# Altium footprint library 20210518.PcbLib: 414 footprints (part 10 of 26)
Each footprint in its own frame and in the unit in brackets; x right, y up, seen from the top. Pads: shape width x height; smd on the part's side, far side on the other; paste and mask are expansions set on the pad; w line width, h text height; cw(c..) or ccw(c..) is an arc to the next point about the centre after c.
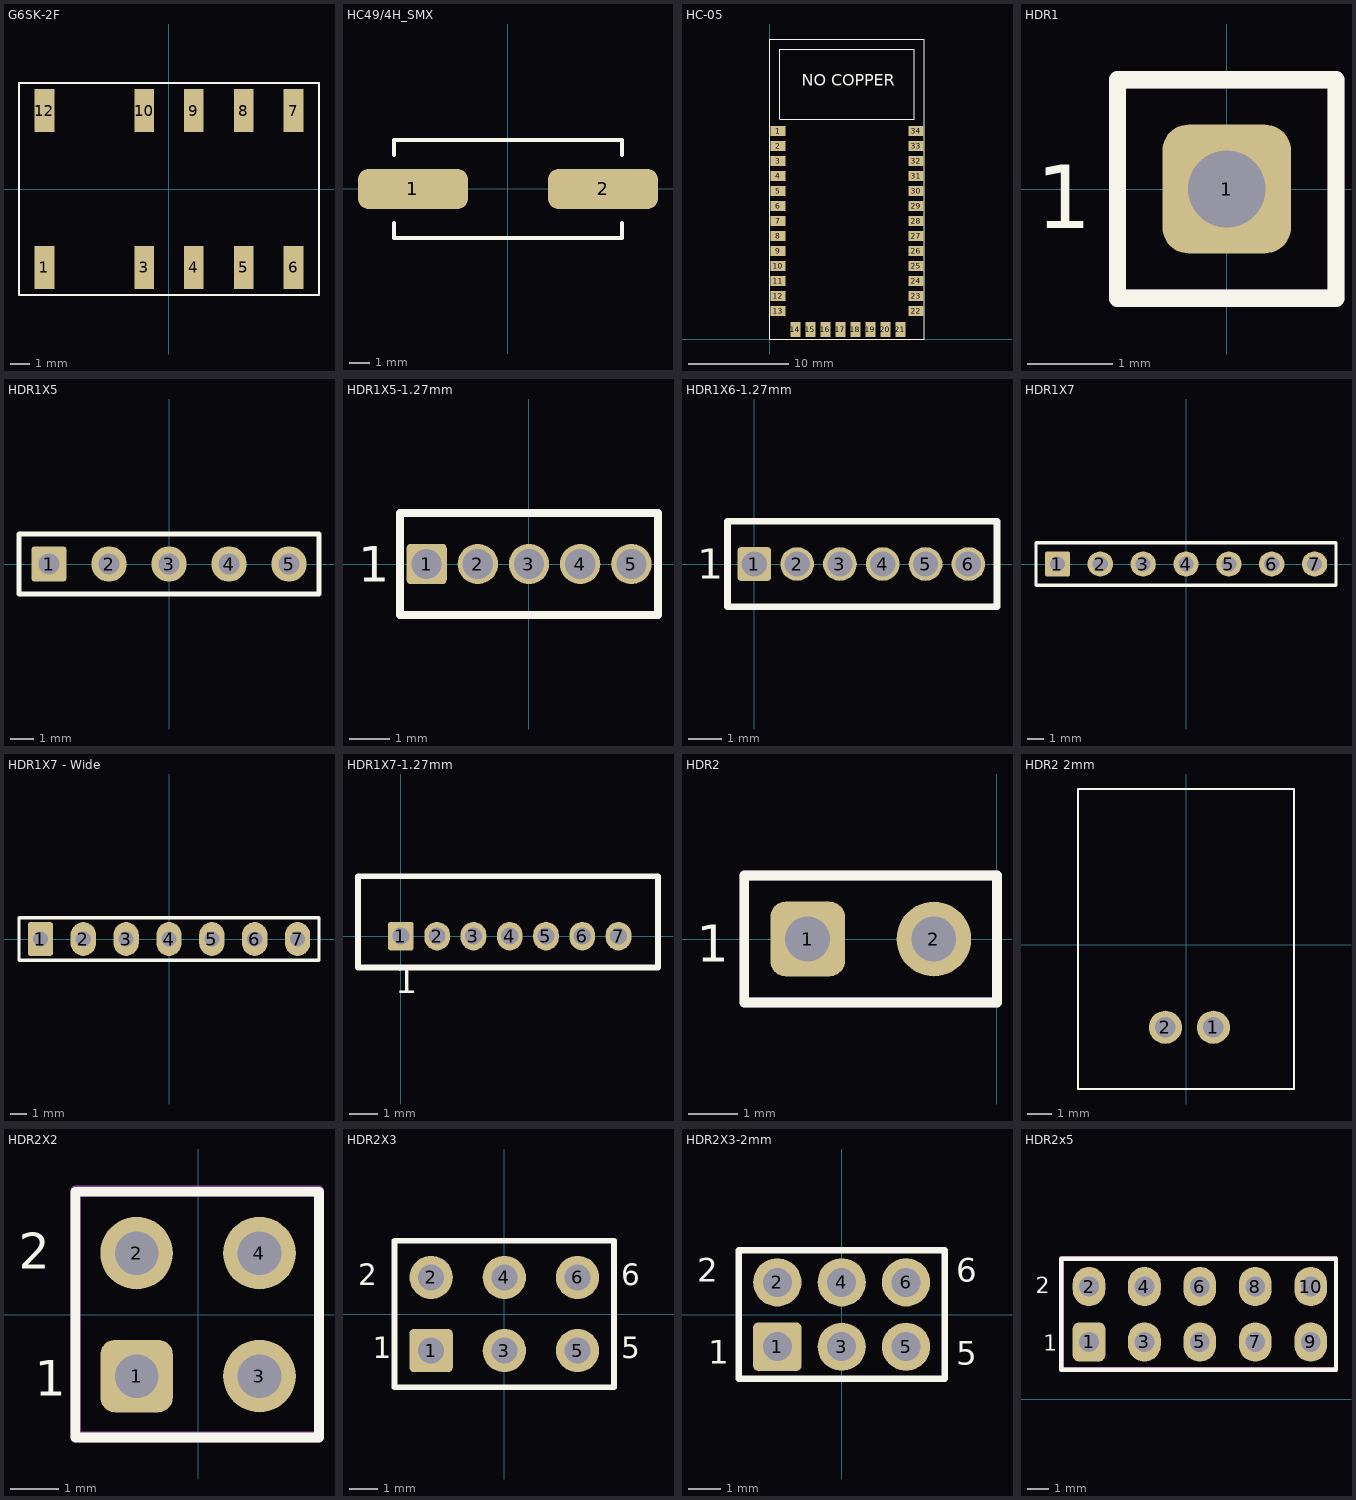
[diagram p9: the footprints below, top view; thin cyan lines are the x and y axes]

## G6SK-2F [mm]
pads (10):
  rect 1x2.2 smd: 1(-6.35,-4) 3(-1.27,-4) 4(1.27,-4) 5(3.81,-4) 6(6.35,-4) 7(6.35,4) 8(3.81,4) 9(1.27,4) 10(-1.27,4) 12(-6.35,4)
Top Overlay:
  lines w0.1: -7.65,-5.4 -7.65,5.4 7.65,5.4 7.65,-5.4 -7.65,-5.4
3D body: height 9.2, standoff 0, extent -7.42,-4.6 7.38,4.6

## HC49/4H_SMX [mm] "Quartz Crystal, SM; Body 13.4 (inc. leads) x 4.9 mm (LxW max)"
height 4.3
pads (2):
  rrect50% 5.5x2 smd: 1(-4.75,0) 2(4.75,0)
Top Overlay:
  lines w0.2: -5.7,-1.7 -5.7,-2.45 5.7,-2.45 5.7,-1.7 ; -5.7,1.7 -5.7,2.45 5.7,2.45 5.7,1.7
3D body: height 4.3, standoff 0, extent -6.4,-2.415 6.4,2.415

## HC-05 [mm] "HC-31 BLUETOOTH 2.0 MODULE -BC417"
pads (34):
  rect 1.5x1 smd: 1(0.866,20.787) 2(0.866,19.287) 3(0.866,17.787) 4(0.866,16.287) 5(0.866,14.787) 6(0.866,13.287) 7(0.866,11.787) 8(0.866,10.287) 9(0.866,8.787) 10(0.866,7.287) 11(0.866,5.787) 12(0.866,4.287) 13(0.866,2.787) 22(14.666,2.787) 23(14.666,4.287) 24(14.666,5.787) 25(14.666,7.287) 26(14.666,8.787) 27(14.666,10.287) 28(14.666,11.787) 29(14.666,13.287) 30(14.666,14.787) 31(14.666,16.287) 32(14.666,17.787) 33(14.666,19.287) 34(14.666,20.787)
  rect 1x1.5 smd: 14(2.587,0.934) 15(4.087,0.934) 16(5.587,0.934) 17(7.087,0.934) 18(8.587,0.934) 19(10.087,0.934) 20(11.587,0.934) 21(13.087,0.934)
Top Overlay:
  lines w0.1: 0,0 15.5,0 15.5,30 0,30 0,0 ; 1,22 1,29 14.5,29 14.5,22 1,22
  text "NO COPPER" at 3.2,24.9 h2
3D body: height 2.35, standoff 0, extent 0.8,1 14.82,29.01

## HDR1 [mm] "Connector; Header; 1 Position"
height 8.5
pads (1):
  rrect40% 1.5x1.5 hole 0.9: 1(0,0)
Top Overlay:
  lines w0.2: -1.275,-1.275 -1.275,1.275 1.275,1.275 1.275,-1.275 -1.275,-1.275
  text "1" at -2.225,-0.7 h1.27
Mechanical 13:
  lines w0.2: -1.275,-1.275 1.275,-1.275 1.275,1.275 -1.275,1.275 -1.275,-1.275
Mechanical 15:
  lines w0.2: -1.275,-1.275 -1.275,1.275 1.275,1.275 1.275,-1.275 -1.275,-1.275

## HDR1X5 [mm] "Connector; Header; 5 Position"
pads (5):
  rrect20% 1.5x1.5 hole 0.9: 1(-5.08,0)
  round 1.5 hole 0.9: 2(-2.54,0) 3(0,0) 4(2.54,0) 5(5.08,0)
Top Overlay:
  lines w0.2: -6.35,-1.27 -6.35,1.27 6.35,1.27 6.35,-1.27 -6.35,-1.27
3D body: height 9.5, standoff -3.2, extent -6.35,-1.27 6.35,1.27

## HDR1X5-1.27mm [mm] "Connector; Header; 5 Position; 1.27mm pitch"
pads (5):
  rrect20% 1x1 hole 0.75: 1(-2.54,0)
  round 1 hole 0.75: 2(-1.27,0) 3(0,0) 4(1.27,0) 5(2.54,0)
Top Overlay:
  lines w0.2: -3.2,-1.27 -3.2,1.27 3.2,1.27 3.2,-1.27 -3.2,-1.27
  text "1" at -4.242,-0.737 h1.52

## HDR1X6-1.27mm [mm] "Connector; Header; 5 Position; 1.27mm pitch"
pads (6):
  rrect20% 1x1 hole 0.75: 1(0,0)
  round 1 hole 0.75: 2(1.27,0) 3(2.54,0) 4(3.81,0) 5(5.08,0) 6(6.35,0)
Top Overlay:
  lines w0.2: -0.8,-1.27 -0.8,1.27 7.2,1.27 7.2,-1.27 -0.8,-1.27
  text "1" at -1.702,-0.737 h1.52

## HDR1X7 [mm] "Connector; Header; 7 Position"
pads (7):
  rrect20% 1.5x1.5 hole 0.9: 1(-7.62,0)
  round 1.5 hole 0.9: 2(-5.08,0) 3(-2.54,0) 4(0,0) 5(2.54,0) 6(5.08,0) 7(7.62,0)
Top Overlay:
  lines w0.2: -8.89,-1.27 -8.89,1.27 8.89,1.27 8.89,-1.27 -8.89,-1.27
3D body: height 8.6, standoff -3.2, extent -8.89,-1.25 8.89,1.25

## HDR1X7 - Wide [mm] "Connector; Header; 7 Position - Wide"
pads (7):
  rrect20% 1.5x2 hole 0.9: 1(-7.62,0)
  oval 1.5x2 hole 0.9: 2(-5.08,0) 3(-2.54,0) 4(0,0) 5(2.54,0) 6(5.08,0) 7(7.62,0)
Top Overlay:
  lines w0.2: -8.89,-1.27 -8.89,1.27 8.89,1.27 8.89,-1.27 -8.89,-1.27
3D body: height 8.6, standoff -3.2, extent -8.89,-1.25 8.89,1.25

## HDR1X7-1.27mm [mm] "Connector; Header; 7 Position; 1.27mm pitch"
pads (7):
  rrect20% 0.9x1 hole 0.6: 1(0,0)
  oval 0.9x1 hole 0.6: 2(1.27,0) 3(2.54,0) 4(3.81,0) 5(5.08,0) 6(6.35,0) 7(7.62,0)
Top Overlay:
  lines w0.2: -1.5,-1.1 -1.5,2.1 9,2.1 9,-1.1 -1.5,-1.1
  text "1" at -0.2,-2.3 h1.52
3D body: height 4.28, standoff -2.22, extent -1.5,-1.2 9,2

## HDR2 [mm] "Connector; Header; 2 Position"
height 8.5
pads (2):
  rrect40% 1.5x1.5 hole 0.9: 1(-3.81,0)
  round 1.5 hole 0.9: 2(-1.27,0)
Top Overlay:
  lines w0.2: -5.085,-1.275 0,-1.275 0,1.275 -5.085,1.275 -5.085,-1.275
  text "1" at -6.035,-0.7 h1.27
Mechanical 13:
  lines w0.2: -5.085,-1.275 -5.085,1.275 0,1.275 0,-1.275 -5.085,-1.275
Mechanical 15:
  lines w0.2: -5.085,-1.275 0,-1.275 0,1.275 -5.085,1.275 -5.085,-1.275
3D body: height 8.5, standoff -3, extent -5.04,-1.369 0.04,1.3

## HDR2 2mm [mil] "2.00mm Pitch MicroClasp Wire-to-Board Header, Single Row, Right-Angle, 2 Circuits, without PCB Locator - 55935-0230"
pads (2):
  round 54.37 / inner round 60 / far side round 54.37 hole 33.46: 1(45,-135) 2(-33.74,-135)
Top Overlay:
  lines w3.94: -177.17,-236.22 -177.17,255.91 177.17,255.91 177.17,-236.22 -177.17,-236.22
3D body: height 267.72, standoff -122, extent -157.48,-216.54 157.48,246.06

## HDR2X2 [mm] "Connector; Header; 2x2 Position"
height 8.5
pads (4):
  rrect40% 1.5x1.5 hole 0.9: 1(-1.27,-1.27)
  round 1.5 hole 0.9: 2(-1.27,1.27) 3(1.27,-1.27) 4(1.27,1.27)
Top Overlay:
  lines w0.2: -2.54,-2.54 2.5,-2.54 2.5,2.54 -2.54,2.54 -2.54,-2.54
  text "1" at -3.375,-1.925 h1.27
  text "2" at -3.7,0.7 h1.27
Mechanical 13:
  lines w0.2: -2.515,-2.54 -2.515,2.54 2.5,2.54 2.5,-2.54 -2.515,-2.54
Mechanical 15:
  lines w0.2: -2.54,-2.515 2.5,-2.515 2.5,2.565 -2.54,2.565 -2.54,-2.515
3D body: height 8.5, standoff -3, extent -2.5,-2.54 2.668,2.54

## HDR2X3 [mm] "Connector; Header; 3x2 Position"
pads (6):
  rrect20% 1.5x1.5 hole 0.9: 1(-2.54,-1.27)
  round 1.5 hole 0.9: 2(-2.54,1.27) 3(0,-1.27) 4(0,1.27) 5(2.54,-1.27) 6(2.54,1.27)
Top Overlay:
  lines w0.2: -1.058,-2.54 3.81,-2.54 ; 3.81,-2.54 3.81,2.54 -3.81,2.54 -3.81,-2.54 3.81,-2.54
  text "6" at 4.064,0.762 h1.27
  text "5" at 4.064,-1.778 h1.27
  text "2" at -5.08,0.762 h1.27
  text "1" at -4.572,-1.778 h1.27
3D body: height 8.6, standoff -3.2, extent -3.81,-2.5 3.81,2.5

## HDR2X3-2mm [mm] "Connector; Header; 3x2 Position"
pads (6):
  rrect20% 1.5x1.5 hole 0.9: 1(-2,-1)
  round 1.5 hole 0.9: 2(-2,1) 3(0,-1) 4(0,1) 5(2,-1) 6(2,1)
Top Overlay:
  lines w0.2: -3.2,-2 3.2,-2 3.2,2 -3.2,2 -3.2,-2
  text "1" at -4.14,-1.778 h1.27
  text "2" at -4.496,0.762 h1.27
  text "5" at 3.556,-1.803 h1.27
  text "6" at 3.556,0.762 h1.27

## HDR2x5 [mm] "Connector; Header; 5x2 Position"
pads (10):
  rrect40% 1.5x1.8 hole 0.9: 1(3.28,2.63)
  oval 1.5x1.8 hole 0.9: 2(3.28,5.17) 3(5.82,2.63) 4(5.82,5.17) 5(8.36,2.63) 6(8.36,5.17) 7(10.9,2.63) 8(10.9,5.17) 9(13.44,2.63) 10(13.44,5.17)
Top Overlay:
  lines w0.2: 2.01,1.36 2.01,6.44 14.6,6.44 14.6,1.36 2.01,1.36
  text "2" at 0.85,4.6 h1.27
  text "1" at 1.175,1.975 h1.27
Mechanical 13:
  lines w0.2: 2.035,1.36 14.6,1.36 14.6,6.44 2.035,6.44 2.035,1.36
Mechanical 15:
  lines w0.2: 2.01,1.385 2.01,6.465 14.6,6.465 14.6,1.385 2.01,1.385